# Altium footprint library XU-GENARAL PCB .PcbLib: 1176 footprints (part 74 of 75)
Each footprint in its own frame and in the unit in brackets; x right, y up, seen from the top. Pads: shape width x height; smd on the part's side, far side on the other; paste and mask are expansions set on the pad; w line width, h text height; cw(c..) or ccw(c..) is an arc to the next point about the centre after c.
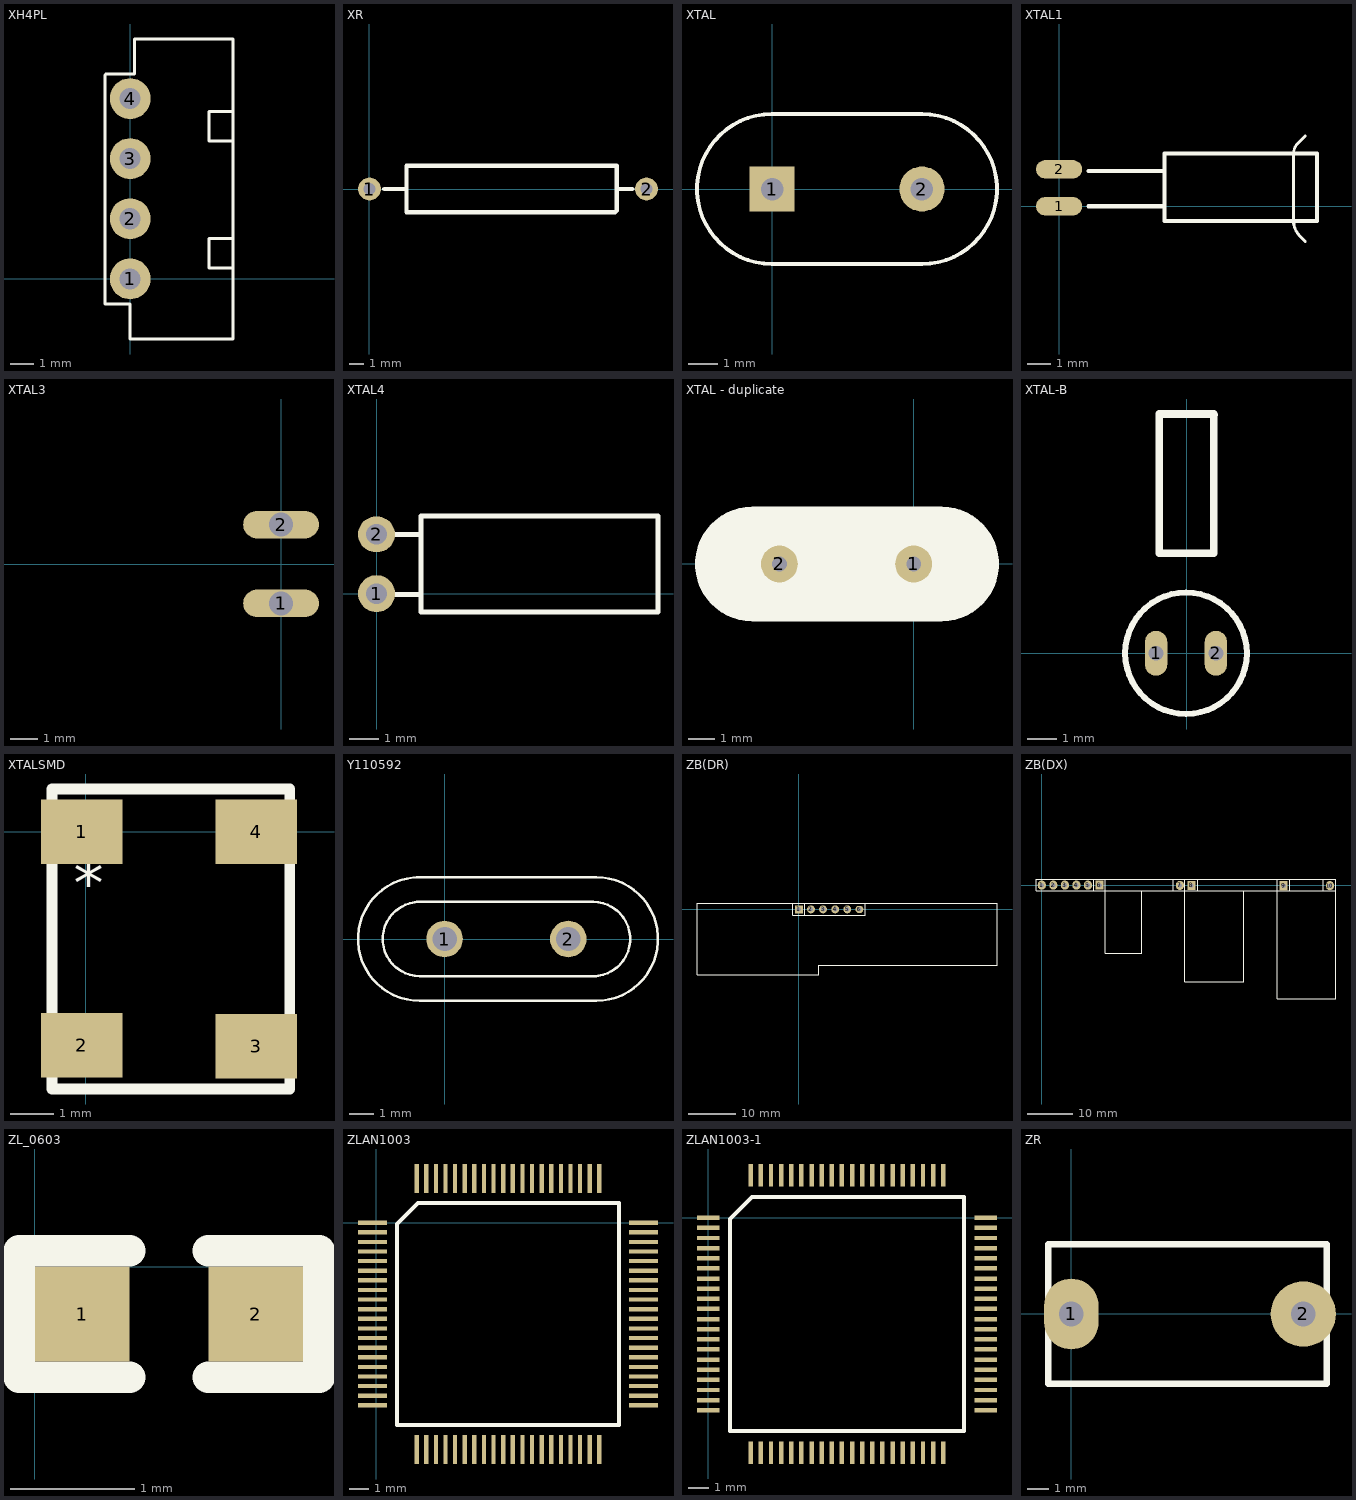
[diagram p73: the footprints below, top view; thin cyan lines are the x and y axes]

## XH4PL [mil]
height 43.31
pads (4):
  round 68 hole 35: 1(0,0) 2(0,100) 3(0,200) 4(0,300)
Top Overlay:
  lines w5: -42,231 -42,339 -40,341 7,341 7,399 158,399 ; -42,243 -42,-42 0,-42 0,-100 136.22,-100 ; 124,-100 170,-100 ; 156,399 171,399 171,-100 ; 168.65,18 130.65,18 130.65,67 168.65,67 ; 168.65,229 130.65,229 130.65,278 168.65,278

## XR [mil]
pads (2):
  round 62 hole 32: 1(0,0) 2(748.03,0)
Top Overlay:
  lines w12: 40,0 100,0 ; 334,-63 663,-63 668,-58 668,63 355,63 ; 356,-63 100,-63 100,63 356,63 ; 667,0 710,0

## XTAL [mil]
pads (2):
  rect 60x60 hole 30: 1(0,0)
  round 60 hole 30: 2(200,0)
Top Overlay:
  lines w5: 0,-100 cw(c0,0) 0,100 200,100 cw(c200,0) 200,-100 0,-100

## XTAL1 [mm]
pads (2):
  oval 2x0.8 smd: 1(0,0) 2(0,1.6)
Top Overlay:
  lines w0.127: 10.16,-0.762 10.16,-0.455 10.16,2.233 ; 10.16,-0.635 ccw(c11.08,-0.635) 10.429,-1.285 10.668,-1.524 ; 10.16,2.286 cw(c10.773,2.286) 10.34,2.72 10.668,3.048
  lines w0.178: 1.27,0 4.572,0 ; 1.27,1.524 4.572,1.524 ; 4.572,-0.635 4.572,2.286 11.176,2.286 11.176,-0.635 4.572,-0.635

## XTAL3 [mil]
pads (2):
  oval 110x40 hole 35: 1(0,-57.09) 2(0,57.09)
Bottom Overlay:
  lines w7: -60,-39.76 0,-39.76 ; -60,40.24 0,40.24 ; -380,-70.07 -60,-70.07 -60,59.93 -380,59.93 -380,-70.07

## XTAL4 [mil]
pads (2):
  round 50 hole 28: 1(0,0)
  oval 50x48 hole 28: 2(0,80)
Top Overlay:
  lines w7: 0,-1 60,-1 ; 0,80 60,80 ; 60,-25 60,105 380,105 380,-25 60,-25

## XTAL - duplicate [mil]
pads (2):
  round 55 hole 22: 1(0,0) 2(-200,0)
Top Overlay:
  region: -264,73.94 -280,73.94 -280,-73.06 -264,-73.06
  region: -253,78.94 -273,78.94 -273,-78.06 -253,-78.06
  region: -240,79.94 -259,79.94 -259,-82.74 -240,-82.74
  region: 41.34,82.68 -240,82.68 -240,-82.68 41.34,-82.68
  region: 58,81 41.34,81 41.34,-82.68 58,-82.68
  region: 70,80.94 58,80.94 58,-78.06 70,-78.06
  region: 79,74.94 69,74.94 69,-75.06 79,-75.06
  region: 88,70.94 77,70.94 77,-70.06 88,-70.06
  lines w6: -240,-82.68 cw(c-240,0) -240,82.68 41.34,82.68 cw(c41.34,0) 41.34,-82.68 -240,-82.68
  lines w10: -317,-24 -317,23 -311,29 -311,-37 -308,-40 -308,43 -302,49 -302,-46 -298,-50 -298,54 -294,58 -294,-55 -289,-60 -289,57 -290,58 -290,59 -283,66 -283,-61 ; 88,-60 90,-58 90,63 91,63 97,57 97,-54 96,-55 100,-51 100,49 111,38 106,33 106,-43 112,-37 112,-33 112,30 118,24 118,-25 ; -283,-61 -280,-64 -283,-61

## XTAL-B [mm]
height 4.65
pads (2):
  oval 0.75x1.5 hole 0.5: 1(-1.02,-0.001) 2(0.98,-0.001)
Top Overlay:
  circle w0.2: c-0.02,-0.001 r2.032
  lines w0.254: 0.93,7.974 0.905,7.999 ; 0.905,7.999 0.905,3.349 -0.92,3.349 -0.92,7.999 0.905,7.999

## XTALSMD [mm]
pads (4):
  rect 1.9x1.5 smd: 1(-0.102,0) 2(-0.102,-4.978) 3(3.97,-5) 4(3.97,0)
Top Overlay:
  lines w0.254: -0.791,-5.994 4.747,-5.994 4.747,0.991 -0.791,0.991 -0.791,-5.994
  text "*" at -0.279,-1.702 h1.02

## Y110592 [mm]
pads (2):
  round 1.5 hole 1: 1(0,0) 2(5.08,0)
Top Overlay:
  lines w0.102: -1.143,1.524 6.096,1.524 cw(c6.096,0) 6.096,-1.524 ; -1.143,2.54 6.223,2.54 cw(c6.223,0) 6.223,-2.54 -1.016,-2.54 cw(c-1.016,0) -1.016,2.54 ; -1.016,1.524 ccw(c-1.016,0) -1.016,-1.524 6.223,-1.524

## ZB(DR) [mil]
pads (6):
  rect 65x65 hole 38: 1(0,0)
  round 65 hole 38: 2(100,0) 3(200,0) 4(300,0) 5(400,0)
  oval 65x60 hole 38: 6(500,0)
Top Overlay:
  lines w8: -840,-539.55 164,-539.55 164,-460.81 1635,-460.81 1635,51 -840,51 -840,-539.55
  lines w10: 50,-50 50,50 ; -50,-50 -50,50 550,50 550,-50 -50,-50

## ZB(DX) [mil]
pads (10):
  oval 70x80 hole 40: 1(0,0) 2(100,0) 3(200,0) 4(300,0) 5(400,0) 10(2495.7,-4.66)
  rect 70x80 hole 40: 6(500,0) 9(2095.7,-4.66)
  oval 70x80 hole 35: 7(1197.09,-2.56)
  rect 70x80 hole 35: 8(1297.09,-2.56)
Top Overlay:
  lines w10: 450,-50 450,50 ; 864.96,-54.04 864.96,-589.55 550,-589.55 550,-50 ; 1140,-50 1140,50 ; 1240,50 1240,-50 1240,-837.4 1751.81,-837.4 ; 1350,-50 1350,50 ; 1750,-837.4 1750,-54 ; 2040,-50 2040,50 ; 2040,-39 2040,-984 2545,-984 2545,-50.3 2544.7,-50 ; 2150,-50 2150,50 ; 2440,-50 2440,50 ; 550,-50 -50,-50 -50,50 550,50 ; 550,-50 550,50 ; 550,-50 2544.7,-50 ; 550,50 2549,50 2549,-45.7 2544.7,-50

## ZL_0603 [mil]
pads (2):
  rect 30x30 smd: 1(15,-15) 2(70,-15)
Top Overlay:
  lines w10: 30,-35 -5,-35 -5,5 30,5 ; 55,-35 90,-35 90,5 55,5

## ZLAN1003 [mm]
pads (80):
  rect 1.5x0.22 smd: 1(-0.2,0) 2(-0.2,-0.5) 3(-0.2,-1) 4(-0.2,-1.5) 5(-0.2,-2) 6(-0.2,-2.5) 7(-0.2,-3) 8(-0.2,-3.5) 9(-0.2,-4) 10(-0.2,-4.5) 11(-0.2,-5) 12(-0.2,-5.5) 13(-0.2,-6) 14(-0.2,-6.5) 15(-0.2,-7) 16(-0.2,-7.5) 17(-0.2,-8) 18(-0.2,-8.5) 19(-0.2,-9) 20(-0.2,-9.5) 41(13.9,-9.5) 42(13.9,-9) 43(13.9,-8.5) 44(13.9,-8) 45(13.9,-7.5) 46(13.9,-7) 47(13.9,-6.5) 48(13.9,-6) 49(13.9,-5.5) 50(13.9,-5) 51(13.9,-4.5) 52(13.9,-4) 53(13.9,-3.5) 54(13.9,-3) 55(13.9,-2.5) 56(13.9,-2) 57(13.9,-1.5) 58(13.9,-1) 59(13.9,-0.5) 60(13.9,0)
  rect 0.22x1.5 smd: 21(2.1,-11.8) 22(2.6,-11.8) 23(3.1,-11.8) 24(3.6,-11.8) 25(4.1,-11.8) 26(4.6,-11.8) 27(5.1,-11.8) 28(5.6,-11.8) 29(6.1,-11.8) 30(6.6,-11.8) 31(7.1,-11.8) 32(7.6,-11.8) 33(8.1,-11.8) 34(8.6,-11.8) 35(9.1,-11.8) 36(9.6,-11.8) 37(10.1,-11.8) 38(10.6,-11.8) 39(11.1,-11.8) 40(11.6,-11.8) 61(11.6,2.3) 62(11.1,2.3) 63(10.6,2.3) 64(10.1,2.3) 65(9.6,2.3) 66(9.1,2.3) 67(8.6,2.3) 68(8.1,2.3) 69(7.6,2.3) 70(7.1,2.3) 71(6.6,2.3) 72(6.1,2.3) 73(5.6,2.3) 74(5.1,2.3) 75(4.6,2.3) 76(4.1,2.3) 77(3.6,2.3) 78(3.1,2.3) 79(2.6,2.3) 80(2.1,2.3)
Top Overlay:
  lines w0.2: 1.085,-10.515 12.615,-10.515 12.615,1.015 2.17,1.015 1.085,-0.07 1.085,-10.515

## ZLAN1003-1 [mm]
pads (80):
  rect 1.1x0.22 smd: 1(0,0) 2(0,-0.5) 3(0,-1) 4(0,-1.5) 5(0,-2) 6(0,-2.5) 7(0,-3) 8(0,-3.5) 9(0,-4) 10(0,-4.5) 11(0,-5) 12(0,-5.5) 13(0,-6) 14(0,-6.5) 15(0,-7) 16(0,-7.5) 17(0,-8) 18(0,-8.5) 19(0,-9) 20(0,-9.5) 41(13.7,-9.5) 42(13.7,-9) 43(13.7,-8.5) 44(13.7,-8) 45(13.7,-7.5) 46(13.7,-7) 47(13.7,-6.5) 48(13.7,-6) 49(13.7,-5.5) 50(13.7,-5) 51(13.7,-4.5) 52(13.7,-4) 53(13.7,-3.5) 54(13.7,-3) 55(13.7,-2.5) 56(13.7,-2) 57(13.7,-1.5) 58(13.7,-1) 59(13.7,-0.5) 60(13.7,0)
  rect 0.22x1.1 smd: 21(2.1,-11.6) 22(2.6,-11.6) 23(3.1,-11.6) 24(3.6,-11.6) 25(4.1,-11.6) 26(4.6,-11.6) 27(5.1,-11.6) 28(5.6,-11.6) 29(6.1,-11.6) 30(6.6,-11.6) 31(7.1,-11.6) 32(7.6,-11.6) 33(8.1,-11.6) 34(8.6,-11.6) 35(9.1,-11.6) 36(9.6,-11.6) 37(10.1,-11.6) 38(10.6,-11.6) 39(11.1,-11.6) 40(11.6,-11.6) 61(11.6,2.1) 62(11.1,2.1) 63(10.6,2.1) 64(10.1,2.1) 65(9.6,2.1) 66(9.1,2.1) 67(8.6,2.1) 68(8.1,2.1) 69(7.6,2.1) 70(7.1,2.1) 71(6.6,2.1) 72(6.1,2.1) 73(5.6,2.1) 74(5.1,2.1) 75(4.6,2.1) 76(4.1,2.1) 77(3.6,2.1) 78(3.1,2.1) 79(2.6,2.1) 80(2.1,2.1)
Top Overlay:
  lines w0.2: 1.085,-10.515 1.085,-0.07 2.17,1.015 12.615,1.015 12.615,-10.515 1.085,-10.515

## ZR [mil]
pads (2):
  oval 100x130 hole 45: 1(0,0)
  round 120 hole 45: 2(425.98,0)
Top Overlay:
  lines w12: -42.91,-127.95 -42.91,127.95 468.9,127.95 468.9,-127.95 -42.91,-127.95